# Altium footprint library First Board IMX6.PcbLib: 204 footprints (part 10 of 13)
Each footprint in its own frame and in the unit in brackets; x right, y up, seen from the top. Pads: shape width x height; smd on the part's side, far side on the other; paste and mask are expansions set on the pad; w line width, h text height; cw(c..) or ccw(c..) is an arc to the next point about the centre after c.
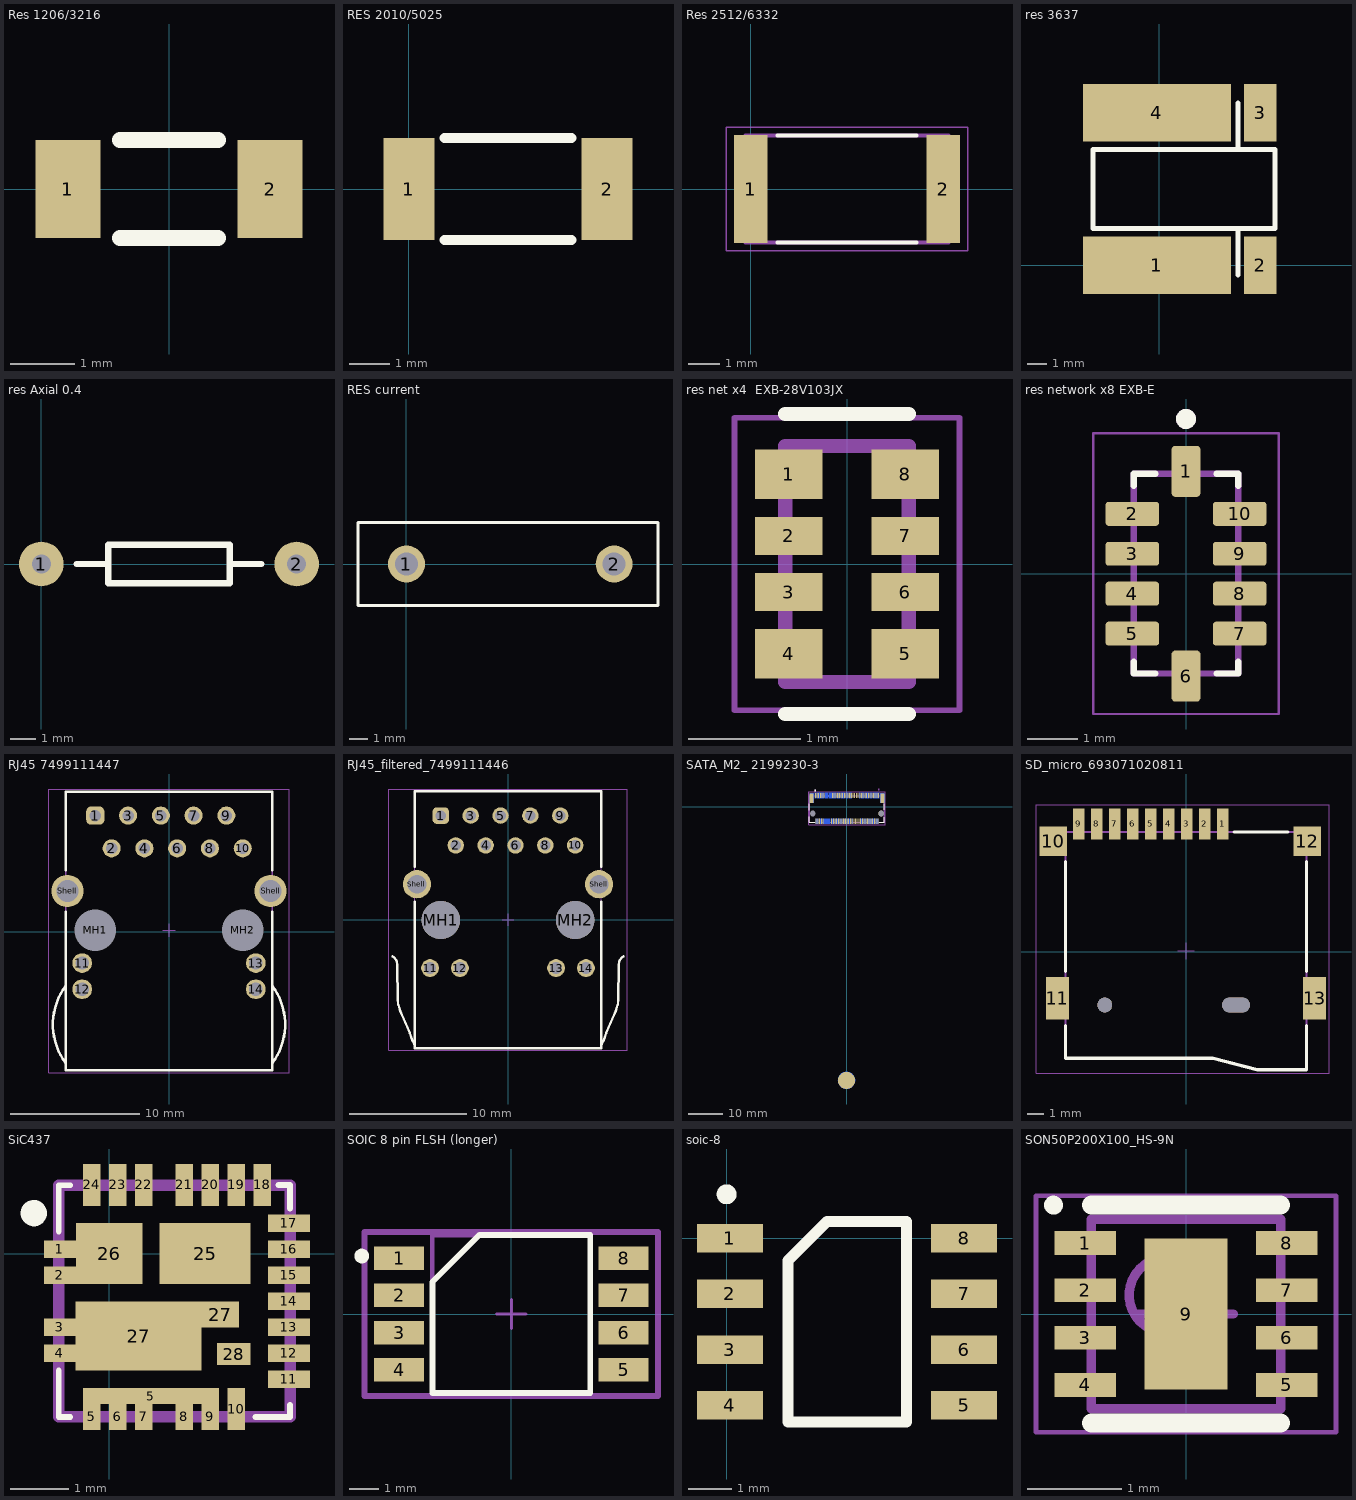
[diagram p9: the footprints below, top view; thin cyan lines are the x and y axes]

## Res 1206/3216 [mil]
pads (2):
  rect 40x60 smd: 1(-62,0) 2(62,0)
Top Overlay:
  lines w10: -30,-30 30,-30 ; -30,30 30,30
3D body "1206.step": height 21.65, standoff 0, extent -59.25,-30.51 59.26,30.52

## RES 2010/5025 [mil]
pads (2):
  rect 50x100 smd: 1(0,0) 2(195,0)
Top Overlay:
  lines w10: 35,-50 160,-50 ; 35,50 160,50
3D body "2010.step": height 23.81, standoff 0.19, extent -1.05,-46.8 195.8,51.62

## Res 2512/6332 [mm]
pads (2):
  rect 1.07x3.42 smd: 1(0,0) 2(6.11,0)
Top Overlay:
  lines w0.127: 0.855,-1.7 5.255,-1.7 ; 0.855,1.7 5.255,1.7
Mechanical 13:
  lines w0.127: -0.165,-1.7 6.275,-1.7 6.275,1.7 -0.165,1.7 -0.165,-1.7
Mechanical 15:
  lines w0.05: -0.785,-1.958 6.895,-1.958 6.895,1.958 -0.785,1.958 -0.785,-1.958
3D body "2512.step": height 0.7, standoff 0.1, extent -0.145,-1.6 6.255,1.6

## res 3637 [mil]
pads (4):
  rect 300x116 smd: 1(-5,0) 4(-5,310)
  rect 66x116 smd: 2(205,0) 3(205,310)
Top Overlay:
  lines w10: 160,70 160,-20 160,75 ; 160,75 -135,75 -135,235 160,235 ; 160,75 235,75 235,235 160,235 ; 160,235 160,330 160,235
3D body "WSL3637.step": height 25, standoff 0, extent -135.08,-24.92 235,334.92

## res Axial 0.4 [mil]
pads (2):
  round 70 hole 30: 1(0,0) 2(400,0)
Top Overlay:
  lines w10: 55,0 105,0 ; 295,-20 295,30 ; 295,-10 295,-30 245,-30 225,-30 185,-30 165,-30 105,-30 105,0 ; 295,5 295,30 ; 300,0 345,0 ; 105,0 105,30 165,30 245,30 295,30
3D body "RESISTOR, 0_25 W, 0_4 IN LEAD PITCH.step": height 115.5, standoff -100, extent -12,-46 412,45

## RES current [mil]
pads (2):
  round 80 hole 50: 1(0,0) 2(450,0)
Top Overlay:
  lines w7: -105,-90 545,-90 545,90 -105,90 -105,-80 -105,-90

## res net x4  EXB-28V103JX [mm]
pads (8):
  rect 0.6x0.44 smd: 1(-0.52,0.8) 4(-0.52,-0.8) 5(0.52,-0.8) 8(0.52,0.8)
  rect 0.6x0.34 smd: 2(-0.52,0.25) 3(-0.52,-0.25) 6(0.52,-0.25) 7(0.52,0.25)
Top Overlay:
  lines w0.127: -0.55,-1.334 0.55,-1.334 ; -0.55,1.334 0.55,1.334
Mechanical 13:
  lines w0.127: -0.55,-1.05 0.55,-1.05 0.55,1.05 -0.55,1.05 -0.55,-1.05
Mechanical 15:
  lines w0.05: -1,-1.3 -1,1.3 1,1.3 1,-1.3 -1,-1.3
3D body "res net x4 EXB-28V103JX.STEP": height 0.45, standoff 0, extent -0.5,-1 0.5,1

## res network x8 EXB-E [mm]
pads (10):
  rrect25% 0.58x1.02 smd: 1(0,2.05) 6(0,-2.05)
  rrect25% 1.07x0.48 smd: 2(-1.075,1.2) 3(-1.075,0.4) 4(-1.075,-0.4) 5(-1.075,-1.2) 7(1.075,-1.2) 8(1.075,-0.4) 9(1.075,0.4) 10(1.075,1.2)
Top Overlay:
  circle w0.2: c0,3.1 r0.1
  lines w0.127: -1.05,-1.76 -1.05,-2 -0.61,-2 ; -1.05,1.76 -1.05,2 -0.61,2 ; 0.61,-2 1.05,-2 1.05,-1.76 ; 0.61,2 1.05,2 1.05,1.76
Mechanical 13:
  circle w0.2: c0,3.1 r0.1
  lines w0.127: -1.05,-2 1.05,-2 1.05,2 -1.05,2 -1.05,-2
Mechanical 15:
  lines w0.05: -1.86,-2.81 -1.86,2.81 1.86,2.81 1.86,-2.81 -1.86,-2.81
3D body "step_temp.STEP": height 0.65, standoff 0, extent -1.05,-2 1.05,2

## RJ45 7499111447 [mm]
pads (18):
  rrect50% 1.4x1.4 hole 0.89: 1(-5.715,8.99)
  round 1.4 hole 0.89: 2(-4.445,6.45) 3(-3.175,8.99) 4(-1.905,6.45) 5(-0.635,8.99) 6(0.635,6.45) 7(1.905,8.99) 8(3.175,6.45) 9(4.445,8.99) 10(5.715,6.45)
  round 1.52 hole 1.02: 11(-6.725,-2.44) 12(-6.725,-4.47) 13(6.725,-2.44) 14(6.725,-4.47)
  round 2 hole 3.2 unplated: MH1(-5.715,0.1) MH2(5.715,0.1)
  round 2.5 hole 1.7: Shell(-7.875,3.15) Shell(7.875,3.15)
Top Overlay:
  lines w0.2: -8,-10.2 cw(c-4,-7.2) -8,-4.2 ; -8,1.55 -8,-10.75 8,-10.75 8,1.55 ; -8,4.75 -8,10.85 8,10.85 8,4.75 ; 8,-10.2 ccw(c4,-7.2) 8,-4.2
Mechanical 11:
  lines w0.1: -8,-10.2 cw(c-4,-7.2) -8,-4.2 ; 8,-10.2 ccw(c4,-7.2) 8,-4.2 ; -8,-10.75 8,-10.75 8,10.85 -8,10.85 -8,-10.75
  text ".Designator" at -1.75,-0.65 h1.5
Mechanical 13:
  lines w0.1: -8,-10.2 cw(c-4,-7.2) -8,-4.2 ; 8,-10.2 ccw(c4,-7.2) 8,-4.2 ; -8,-10.75 -8,10.85 8,10.85 8,-10.75 -8,-10.75
Mechanical 15:
  lines w0.05: -0.5,0.1 0.5,0.1 ; 0,-0.4 0,0.6 ; -9.325,-10.95 -9.325,11.05 9.325,11.05 9.325,-10.95 -9.325,-10.95
3D body "7499111447.stp": height 14.65, standoff -2.98, extent -8.956,-10.75 8.956,10.85

## RJ45_filtered_7499111446 [mm]
pads (18):
  rrect50% 1.4x1.4 hole 0.9: 1(-5.715,8.86)
  round 1.4 hole 0.9: 2(-4.445,6.32) 3(-3.175,8.86) 4(-1.905,6.32) 5(-0.635,8.86) 6(0.635,6.32) 7(1.905,8.86) 8(3.175,6.32) 9(4.445,8.86) 10(5.715,6.32)
  round 1.52 hole 1.02: 11(-6.63,-4.11) 12(-4.09,-4.11) 13(4.09,-4.11) 14(6.63,-4.11)
  round 3.25 hole 3.25 unplated: MH1(-5.715,-0.03) MH2(5.715,-0.03)
  round 2.4 hole 1.6: Shell(-7.745,3.02) Shell(7.745,3.02)
Top Overlay:
  lines w0.2: -9.83,-3.109 cw(c-10.225,-3.801) -9.428,-3.801 -9.37,-6.9 ccw(c-8.1,-6.9) -9.27,-7.394 ccw(c-6.8,-6.9) -9.012,-8.105 -8.345,-9.664 ccw(c-2,-7.78) -7.94,-10.7 ; -7.94,1.53 -7.94,-10.92 7.94,-10.92 7.94,1.53 ; -7.94,4.48 -7.94,10.92 7.94,10.92 7.94,4.48 ; 7.94,-10.7 ccw(c2,-7.78) 8.345,-9.664 9.012,-8.105 ccw(c6.8,-6.9) 9.27,-7.394 ccw(c8.1,-6.9) 9.37,-6.9 9.428,-3.801 cw(c10.225,-3.801) 9.83,-3.109
Mechanical 11:
  lines w0.1: -9.83,-3.109 cw(c-10.225,-3.801) -9.428,-3.801 -9.37,-6.9 ccw(c-8.1,-6.9) -9.27,-7.394 ccw(c-6.8,-6.9) -9.012,-8.105 -8.345,-9.664 ccw(c-2,-7.78) -7.94,-10.7 ; 7.94,-10.7 ccw(c2,-7.78) 8.345,-9.664 9.012,-8.105 ccw(c6.8,-6.9) 9.27,-7.394 ccw(c8.1,-6.9) 9.37,-6.9 9.428,-3.801 cw(c10.225,-3.801) 9.83,-3.109 ; -7.94,-10.92 7.94,-10.92 7.94,10.92 -7.94,10.92 -7.94,-10.92
  text ".Designator" at -1.75,-0.75 h1.5
Mechanical 13:
  lines w0.1: -9.83,-3.109 cw(c-10.225,-3.801) -9.428,-3.801 -9.37,-6.9 ccw(c-8.1,-6.9) -9.27,-7.394 ccw(c-6.8,-6.9) -9.012,-8.105 -8.345,-9.664 ccw(c-2,-7.78) -7.94,-10.7 ; 7.94,-10.7 ccw(c2,-7.78) 8.345,-9.664 9.012,-8.105 ccw(c6.8,-6.9) 9.27,-7.394 ccw(c8.1,-6.9) 9.37,-6.9 9.428,-3.801 cw(c10.225,-3.801) 9.83,-3.109 ; -7.94,-10.92 -7.94,10.92 7.94,10.92 7.94,-10.92 -7.94,-10.92
Mechanical 15:
  lines w0.05: -0.5,0 0.5,0 ; 0,-0.5 0,0.5 ; -10.13,-11.12 -10.13,11.12 10.13,11.12 10.13,-11.12 -10.13,-11.12
3D body "7499111446.stp": height 16.01, standoff -3.52, extent -9.923,-10.92 9.923,10.92

## SATA_M2_ 2199230-3 [mm]
pads (142):
  rect 0.3x1.55 smd: 1(-9.123,3.243) 2(-8.873,-4.307) 3(-8.623,3.243) 4(-8.373,-4.307) 5(-8.123,3.243) 6(-7.873,-4.307) 7(-7.623,3.243) 8(-7.373,-4.307) 9(-7.123,3.243) 10(-6.873,-4.307) 11(-6.623,3.243) 20(-4.373,-4.307) 21(-4.123,3.243) 22(-3.873,-4.307) 23(-3.623,3.243) 24(-3.373,-4.307) 25(-3.123,3.243) 26(-2.873,-4.307) 27(-2.623,3.243) 28(-2.373,-4.307) 29(-2.123,3.243) 30(-1.873,-4.307) 31(-1.623,3.243) 32(-1.373,-4.307) 33(-1.123,3.243) 34(-0.873,-4.307) 35(-0.623,3.243) 36(-0.373,-4.307) 37(-0.123,3.243) 38(0.127,-4.307) 39(0.377,3.243) 40(0.627,-4.307) 41(0.877,3.243) 42(1.127,-4.307) 43(1.377,3.243) 44(1.627,-4.307) 45(1.877,3.243) 46(2.127,-4.307) 47(2.377,3.243) 48(2.627,-4.307) 49(2.877,3.243) 50(3.127,-4.307) 51(3.377,3.243) 52(3.627,-4.307) 53(3.877,3.243) 54(4.127,-4.307) 55(4.377,3.243) 56(4.627,-4.307) 57(4.877,3.243) 58(5.127,-4.307) 59(5.377,3.243) 60(5.627,-4.307) 61(5.877,3.243) 62(6.127,-4.307) 63(6.377,3.243) 64(6.627,-4.307) 65(6.877,3.243) 66(7.127,-4.307) 67(7.377,3.243) 68(7.627,-4.307) 69(7.877,3.243) 70(8.127,-4.307) 71(8.377,3.243) 72(8.627,-4.307) 73(8.877,3.243) 74(9.127,-4.307) 75(9.377,3.243)
  rect 0.3x1.55 smd far side: 1A(9.4,3.25) 2A(9.15,-4.3) 3A(8.9,3.25) 4A(8.65,-4.3) 5A(8.4,3.25) 6A(8.15,-4.3) 7A(7.9,3.25) 8A(7.65,-4.3) 9A(7.4,3.25) 10A(7.15,-4.3) 11A(6.9,3.25) 12A(6.65,-4.3) 13A(6.4,3.25) 14A(6.15,-4.3) 15A(5.9,3.25) 16A(5.65,-4.3) 17A(5.4,3.25) 18A(5.15,-4.3) 19A(4.9,3.25) 20A(4.65,-4.3) 21A(4.4,3.25) 22A(4.15,-4.3) 23A(3.9,3.25) 32A(1.65,-4.3) 33A(1.4,3.25) 34A(1.15,-4.3) 35A(0.9,3.25) 36A(0.65,-4.3) 37A(0.4,3.25) 38A(0.15,-4.3) 39A(-0.1,3.25) 40A(-0.35,-4.3) 41A(-0.6,3.25) 42A(-0.85,-4.3) 43A(-1.1,3.25) 44A(-1.35,-4.3) 45A(-1.6,3.25) 46A(-1.85,-4.3) 47A(-2.1,3.25) 48A(-2.35,-4.3) 49A(-2.6,3.25) 50A(-2.85,-4.3) 51A(-3.1,3.25) 52A(-3.35,-4.3) 53A(-3.6,3.25) 54A(-3.85,-4.3) 55A(-4.1,3.25) 56A(-4.35,-4.3) 57A(-4.6,3.25) 58A(-4.85,-4.3) 59A(-5.1,3.25) 60A(-5.35,-4.3) 61A(-5.6,3.25) 62A(-5.85,-4.3) 63A(-6.1,3.25) 64A(-6.35,-4.3) 65A(-6.6,3.25) 66A(-6.85,-4.3) 67A(-7.1,3.25) 68A(-7.35,-4.3) 69A(-7.6,3.25) 70A(-7.85,-4.3) 71A(-8.1,3.25) 72A(-8.35,-4.3) 73A(-8.6,3.25) 74A(-8.85,-4.3) 75A(-9.1,3.25)
  rect 1.2x2.75 smd: S1(-10.223,2.468) S2(10.477,2.468)
  rrect15% 1.2x2.75 smd far side: SHIELDA(-10.2,2.475) SHIELDA(10.5,2.475)
  round 1.15 hole 1.65 unplated: ""(-9.873,-2.032)
  round 5 smd: ""(0,-80)
  round 5 smd far side: ""(0,-79.95)
  round 1.65 hole 1.65 unplated: ""(10.127,-2.032)
Top Overlay:
  circle w0.2: c-9.123,4.668 r0.1
  lines w0.127: -10.823,-2.927 -10.823,-4.532 -9.343,-4.532 ; -10.823,-1.137 -10.823,0.773 ; -6.403,-4.532 -4.843,-4.532 ; -6.153,3.218 -4.593,3.218 ; 9.597,-4.532 11.077,-4.532 11.077,-3.177 ; 11.077,-0.887 11.077,0.773
Bottom Overlay:
  circle w0.2: c9.4,5.025 r0.1
  lines w0.127: -10.8,-2.925 -10.8,-4.525 -9.32,-4.525 ; -10.8,-0.905 -10.8,0.78 ; 1.87,3.225 3.43,3.225 ; 2.15,-4.525 3.65,-4.525 ; 9.62,-4.525 11.1,-4.525 11.1,0.78
Mechanical 13:
  circle w0.2: c-9.123,4.668 r0.1
  circle w0.2: c9.4,5.025 r0.1
  lines w0.127: -10.823,-4.532 11.077,-4.532 11.077,3.218 -10.823,3.218 -10.823,-4.532 ; -10.8,-4.525 11.1,-4.525 11.1,3.225 -10.8,3.225 -10.8,-4.525
Mechanical 15:
  lines w0.05: -11.073,4.268 11.327,4.268 ; -11.05,-5.325 -11.05,4.275 11.35,4.275 11.35,-5.325 -11.05,-5.325
3D body "sata_M_2_2199230-3.stp": height 4.09, standoff -0.62, extent -10.825,-4.925 11.075,3.775
3D body "9774010243.stp": height 2.4, standoff 0, extent -2.225,-82.147 2.125,-77.803
3D body "step_temp.STEP": height 4.2, standoff -0.65, extent -10.727,-4.902 11.173,3.798
3D body "9774010243.stp": height -2, standoff -4.4, extent -2.225,-82.097 2.125,-77.753

## SD_micro_693071020811 [mm]
pads (15):
  rect 0.7x1.9 smd: 1(2.25,7.8) 2(1.15,7.8) 3(0.05,7.8) 4(-1.05,7.8) 5(-2.15,7.8) 6(-3.25,7.8) 7(-4.35,7.8) 8(-5.45,7.8) 9(-6.55,7.8)
  rect 1.7x1.8 smd: 10(-8.1,6.75) 12(7.4,6.75)
  rect 1.4x2.6 smd: 11(-7.85,-2.85) 13(7.85,-2.85)
  round 0.9 hole 0.9 unplated: ""(-4.95,-3.25)
  oval 1.7x0.9 hole 0.9 slot 1.7 at 0 deg unplated: ""(3.05,-3.25)
Top Overlay:
  lines w0.2: -7.35,-4.5 -7.35,-6.5 1.65,-6.5 4.35,-7.198 ; -7.35,-1.2 -7.35,5.5 ; 2.95,7.3 6.2,7.3 ; 4.35,-7.2 7.35,-7.2 7.35,-4.5 ; 7.35,-1.2 7.35,5.5
Mechanical 11:
  lines w0.1: 4.35,-7.2 7.35,-7.2 7.35,7.3 -7.35,7.3 -7.35,-6.5 1.65,-6.5 4.35,-7.198
Mechanical 13:
  lines w0.1: 4.35,-7.2 7.35,-7.2 7.35,7.3 -7.35,7.3 -7.35,-6.5 1.65,-6.5 4.35,-7.198
Mechanical 15:
  lines w0.05: -0.5,0.05 0.5,0.05 ; 0,-0.45 0,0.55 ; -9.15,-7.4 -9.15,8.95 8.75,8.95 8.75,-7.4 -9.15,-7.4
3D body "693071020811.stp": height 1.85, standoff -0.63, extent -8.2,-7.25 8.2,7.776

## SiC437 [mm]
pads (30):
  rect 0.55x0.3 smd: 1(-0.85,0.075) 2(-0.85,-0.375) 3(-0.85,-1.275) 4(-0.85,-1.725)
  rect 0.3x0.45 smd: 5(-0.3,-2.825) 6(0.15,-2.825) 7(0.6,-2.825) 8(1.3,-2.825) 9(1.75,-2.825)
  rect 2.35x0.275 smd: 5(0.725,-2.463)
  rect 0.3x0.725 smd: 10(2.2,-2.688) 18(2.65,1.187) 19(2.2,1.187) 20(1.75,1.187) 21(1.3,1.187) 22(0.6,1.187) 23(0.15,1.187) 24(-0.3,1.187)
  rect 0.725x0.3 smd: 11(3.112,-2.175) 12(3.112,-1.725) 13(3.112,-1.275) 14(3.112,-0.825) 15(3.112,-0.375) 16(3.112,0.075) 17(3.112,0.525)
  rect 1.575x1.05 smd: 25(1.662,0)
  rect 1.15x1.05 smd: 26(0,0)
  rect 2.175x1.2 smd: 27(0.512,-1.425)
  rect 0.65x0.455 smd: 27(1.925,-1.053)
  rect 0.58x0.38 smd: 28(2.16,-1.74)
Top Overlay:
  circle w0.254: c-1.3,0.7 r0.1
  lines w0.1: -0.869,-2.019 -0.869,-2.825 -0.669,-2.825 ; -0.869,0.381 -0.869,1.181 -0.669,1.181 ; 2.531,-2.825 3.131,-2.825 3.131,-2.619 ; 2.931,1.187 3.131,1.187 3.131,0.781
Mechanical 13:
  lines w0.2: -0.869,-2.819 -0.869,1.181 3.131,1.181 3.131,-2.819 -0.869,-2.819
3D body "MLP44-24L-sic437.STEP": height 0.8, standoff 0, extent -0.85,-2.827 3.151,1.175

## SOIC 8 pin FLSH (longer) [mm]
pads (8):
  rect 1.7x0.8 smd paste-1000: 1(-3.825,1.905) 2(-3.825,0.635) 3(-3.825,-0.635) 4(-3.825,-1.905) 5(3.825,-1.905) 6(3.825,-0.635) 7(3.825,0.635) 8(3.825,1.905)
Top Overlay:
  circle w0.25: c-5.1,1.975 r0.125
  lines w0.2: 2.69,-2.68 2.69,-2.69 ; 2.69,-2.69 -2.69,-2.69 -2.69,1.089 -1.089,2.69 2.69,2.69 2.69,2.68 2.69,-2.69
Top Paste:
  rectangle: 3.1,-2.255 4.475,-1.555
  rectangle: 3.025,-0.95 4.625,-0.25
  rectangle: 3.025,0.275 4.6,0.975
  rectangle: 2.925,1.55 4.725,2.25
  rectangle: -4.75,1.555 -2.95,2.255
  rectangle: -4.75,0.285 -2.95,0.985
  rectangle: -4.75,-0.985 -2.95,-0.285
  rectangle: -4.75,-2.255 -2.95,-1.555
Top Assembly:
  lines w0.2: -5,-2.79 -5,2.79 5,2.79 5,-2.79 -5,-2.79
  text ".Designator" at 0,0 h1
Mechanical 10:
  lines w0.2: -5,-2.79 5,-2.79 5,2.79 -5,2.79 -5,-2.79
Bottom Assembly:
  lines w0.15: -2.69,-2.69 2.69,-2.69 2.69,2.69 -2.69,2.69 -2.69,-2.69
Mechanical 15:
  lines w0.1: -0.5,0 0.5,0 ; 0,-0.5 0,0.5
3D body "IC_Winbond_W25Q64JVSSIQ_eec.STEP": height 0.25, standoff 0, extent -5,-2.79 5,2.79

## soic-8 [mm]
pads (8):
  rect 1.5x0.65 smd: 1(0.075,0) 2(0.075,-1.27) 3(0.075,-2.54) 4(0.075,-3.81) 5(5.416,-3.81) 6(5.416,-2.54) 7(5.416,-1.27) 8(5.416,0)
Top Overlay:
  circle w0.254: c0,1 r0.1
  lines w0.254: 1.397,-4.191 4.1,-4.191 4.1,0.381 2.286,0.381 1.397,-0.508 1.397,-4.191
3D body "SOIC-8.step": height 1.75, standoff 0, extent -0.2,-4.35 5.8,0.55

## SON50P200X100_HS-9N [mm] "SON, 8-Leads, Body 2,00x2,00mm, Pitch 0,50mm, Thermal Pad 1,60x0,88mm, IPC Medium Density"
height 1
pads (9):
  rect 0.65x0.25 smd: 1(-1.065,0.75) 2(-1.065,0.25) 3(-1.065,-0.25) 4(-1.065,-0.75) 5(1.065,-0.75) 6(1.065,-0.25) 7(1.065,0.25) 8(1.065,0.75)
  rect 0.88x1.6 smd: 9(0,0)
Top Overlay:
  circle w0.1: c-1.4,1.15 r0.05
  lines w0.2: -1,-1.15 1,-1.15 ; -1,1.15 1,1.15
Mechanical 13:
  circle w0.1: c-0.2,0.2 r0.4
  lines w0.1: -1,-1 1,-1 1,1 -1,1 -1,-1
Mechanical 15:
  lines w0.05: -1.585,-1.25 1.585,-1.25 1.585,1.25 -1.585,1.25 -1.585,-1.25
  lines w0.1: -0.5,0 0.5,0 ; 0,-0.5 0,0.5
3D body: height 1, standoff 0.1, extent -1,-1 1,1